# Altium footprint library 传感器和模块.PcbLib: 24 footprints (part 2 of 2)
Each footprint in its own frame and in the unit in brackets; x right, y up, seen from the top. Pads: shape width x height; smd on the part's side, far side on the other; paste and mask are expansions set on the pad; w line width, h text height; cw(c..) or ccw(c..) is an arc to the next point about the centre after c.
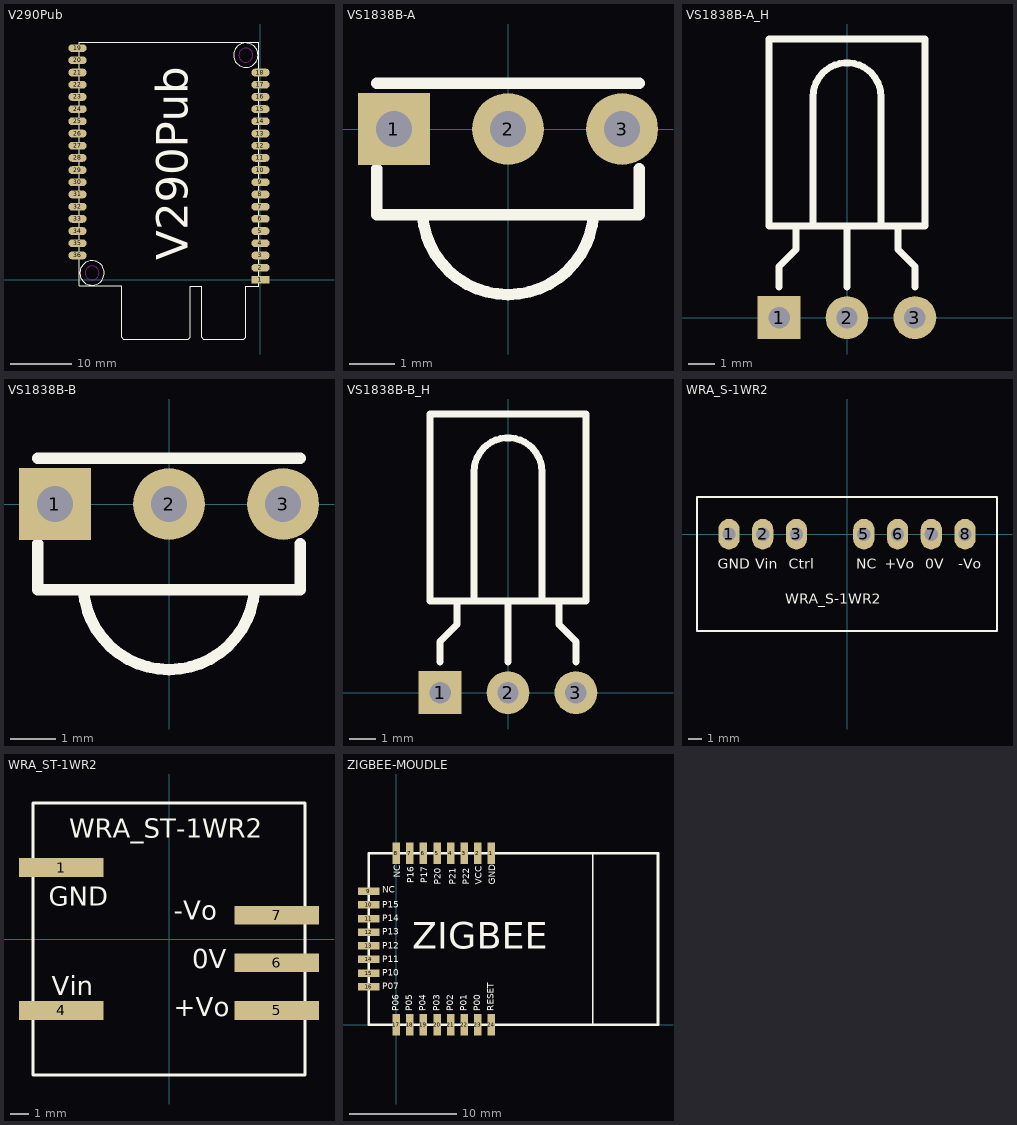
[diagram p1: the footprints below, top view; thin cyan lines are the x and y axes]

## V290Pub [mm]
height 10
pads (36):
  rect 3x1.27 smd: 1(0,0)
  oval 3x1.27 smd: 2(0,2) 3(0,4) 4(0,6) 5(0,8) 6(0,10) 7(0,12) 8(0,14) 9(0,16) 10(0,18) 11(0,20) 12(0,22) 13(0,24) 14(0,26) 15(0,28) 16(0,30) 17(0,32) 18(0,34) 19(-30.008,38) 20(-30.008,36) 21(-30.008,34) 22(-30.008,32) 23(-30.008,30) 24(-30.008,28) 25(-30.008,26) 26(-30.008,24) 27(-30.008,22) 28(-30.008,20) 29(-30.008,18) 30(-30.008,16) 31(-30.008,14) 32(-30.008,12) 33(-30.008,10) 34(-30.008,8) 35(-30.008,6) 36(-30.008,4)
Top Overlay:
  circle w0.127: c-27.62,1.134 r2
  circle w0.127: c-2.398,36.846 r2
  lines w0.127: -29.754,-1 -22.754,-1 -22.754,-9.446 -22.5,-9.7 -11.808,-9.7 -11.554,-9.446 -11.554,-1.024 -9.654,-1.024 -9.654,-9.446 -9.4,-9.7 -2.708,-9.7 -2.454,-9.446 -2.454,-9.406 -2.454,-1.024 -0.254,-1.024 -0.254,39 -22.769,39 -29.754,39 -29.754,-1
  text "V290Pub" at -11.938,3.175 h5.2
Keep-Out Layer:
  circle w0.127: c-2.398,36.846 r1.145
  circle w0.127: c-27.62,1.134 r1.145

## VS1838B-A [mm]
pads (3):
  rect 1.6x1.6 hole 0.8: 1(-2.54,0)
  round 1.6 hole 0.8: 2(0,0) 3(2.54,0)
Top Overlay:
  lines w0.254: -2.921,-0.889 -2.921,-1.905 2.921,-1.905 2.921,-0.889 ; -2.921,1.016 2.921,1.016 ; -1.905,-1.905 ccw(c0,-1.778) 1.905,-1.905
3D body "VS1838B-A-.STEP": height 8.3, standoff -3.5, extent -2.713,-3.638 2.967,0.762

## VS1838B-A_H [mm]
pads (3):
  rect 1.6x1.6 hole 0.8: 1(-2.54,0)
  round 1.6 hole 0.8: 2(0,0) 3(2.54,0)
Top Overlay:
  lines w0.254: -2.54,1.143 -2.54,1.905 -1.905,2.54 -1.905,3.429 ; -1.27,3.429 -1.27,8.255 cw(c0,8.255) 1.27,8.255 1.27,3.429 ; 0,1.143 0,3.429 ; 1.905,3.429 1.905,2.54 2.54,1.905 2.54,1.143 ; -2.921,3.429 -2.921,10.414 2.921,10.414 2.921,3.429 -2.921,3.429
3D body "VS1838B-A_H-.STEP": height 4.4, standoff -3.5, extent -2.84,-0.254 2.84,10.246

## VS1838B-B [mm]
pads (3):
  rect 1.6x1.6 hole 0.8: 1(-2.54,0)
  round 1.6 hole 0.8: 2(0,0) 3(2.54,0)
Top Overlay:
  lines w0.254: -2.921,-0.889 -2.921,-1.905 2.921,-1.905 2.921,-0.889 ; -2.921,1.016 2.921,1.016 ; -1.905,-1.905 ccw(c0,-1.778) 1.905,-1.905
3D body "VS1838B-B-.STEP": height 8.65, standoff -3.5, extent -3.302,-3.947 3.498,1.153

## VS1838B-B_H [mm]
pads (3):
  rect 1.6x1.6 hole 0.8: 1(-2.54,0)
  round 1.6 hole 0.8: 2(0,0) 3(2.54,0)
Top Overlay:
  lines w0.254: -2.54,1.143 -2.54,1.905 -1.905,2.54 -1.905,3.429 ; -1.27,3.429 -1.27,8.255 cw(c0,8.255) 1.27,8.255 1.27,3.429 ; 0,1.143 0,3.429 ; 1.905,3.429 1.905,2.54 2.54,1.905 2.54,1.143 ; -2.921,3.429 2.921,3.429 2.921,10.414 -2.921,10.414 -2.921,3.429
3D body "VS1838B-B_H-.STEP": height 5.15, standoff -3.1, extent -3.371,-0.218 3.429,10.632

## WRA_S-1WR2 [mm]
pads (7):
  oval 1.6x2.3 hole 1: 1(-8.89,0) 2(-6.35,0) 3(-3.81,0) 5(1.27,0) 6(3.81,0) 7(6.35,0) 8(8.89,0)
Top Overlay:
  lines w0.127: -11.3,-7.3 11.3,-7.3 11.3,2.8 -11.3,2.8 -11.3,-7.3
  text "NC" at 0.686,-2.608 h0.76
  text "Ctrl" at -4.381,-2.608 h0.76
  text "Vin" at -6.921,-2.608 h0.76
  text "WRA_S-1WR2" at -4.655,-5.232 h0.76
  text "GND" at -9.728,-2.608 h0.76
  text "0V" at 5.911,-2.608 h0.76
  text "-Vo" at 8.377,-2.608 h0.76
  text "+Vo" at 2.848,-2.608 h0.76
3D body "WRA_S-1WR2.stp": height 12, standoff -4.1, extent -10.922,-7.112 11.078,2.388

## WRA_ST-1WR2 [mm]
pads (5):
  rect 4.5x1 smd: 1(-5.75,3.81) 4(-5.75,-3.81) 5(5.75,-3.81) 6(5.75,-1.27) 7(5.75,1.27)
Top Overlay:
  lines w0.15: -7.25,-7.25 -7.25,7.25 7.25,7.25 7.25,-7.25 -7.25,-7.25
  text "WRA_ST-1WR2" at -5.321,5.397 h1.02
  text "GND" at -6.401,1.778 h1.02
  text "Vin" at -6.248,-2.997 h1.02
  text "+Vo" at 0.261,-4.132 h1.02
  text "0V" at 1.246,-1.549 h1.02
  text "-Vo" at 0.261,1.034 h1.02
3D body "WRA_ST-1WR2.stp": height 9, standoff -0.1, extent -7.62,-7 7.38,7

## ZIGBEE-MOUDLE [mm]
height 1.3
pads (24):
  rect 0.7x2 smd: 1(8.89,16.026) 2(7.62,16.026) 3(6.35,16.026) 4(5.08,16.026) 5(3.81,16.026) 6(2.54,16.026) 7(1.27,16.026) 8(0,16.026) 17(0,0) 18(1.27,0) 19(2.54,0) 20(3.81,0) 21(5.08,0) 22(6.35,0) 23(7.62,0) 24(8.89,0)
  rect 2x0.7 smd: 9(-2.568,12.458) 10(-2.568,11.188) 11(-2.568,9.918) 12(-2.568,8.648) 13(-2.568,7.378) 14(-2.568,6.108) 15(-2.568,4.838) 16(-2.568,3.568)
Top Overlay:
  lines w0.127: 18.369,0.013 18.369,16.015
  lines w0.254: -2.555,0.013 24.445,0.013 24.445,16.013 -2.555,16.013 -2.555,0.013
  text "GND" at 9.256,13.094 h0.6
  text "VCC" at 7.986,13.094 h0.6
  text "P22" at 6.843,13.094 h0.6
  text "P21" at 5.573,13.094 h0.6
  text "P20" at 4.176,13.094 h0.6
  text "P17" at 2.906,13.221 h0.6
  text "P16" at 1.636,13.221 h0.6
  text "NC" at 0.366,13.729 h0.6
  text "RESET" at 9.129,1.283 h0.6
  text "P00" at 7.859,1.283 h0.6
  text "P01" at 6.589,1.283 h0.6
  text "P02" at 5.319,1.283 h0.6
  text "P03" at 4.049,1.283 h0.6
  text "P04" at 2.779,1.283 h0.6
  text "P05" at 1.509,1.283 h0.6
  text "P06" at 0.239,1.283 h0.6
  text "P07" at -1.285,3.315 h0.6
  text "P10" at -1.285,4.585 h0.6
  text "P11" at -1.285,5.855 h0.6
  text "P12" at -1.285,7.125 h0.6
  text "P14" at -1.285,9.665 h0.6
  text "P13" at -1.285,8.395 h0.6
  text "P15" at -1.285,10.935 h0.6
  text "NC" at -1.285,12.332 h0.6
  text "ZIGBEE" at 1.509,7.125 h2.5